# Altium footprint library Molex FFC - FPC Connectors (SMT).PcbLib: 638 footprints (part 7 of 40)
Each footprint in its own frame and in the unit in brackets; x right, y up, seen from the top. Pads: shape width x height; smd on the part's side, far side on the other; paste and mask are expansions set on the pad; w line width, h text height; cw(c..) or ccw(c..) is an arc to the next point about the centre after c.
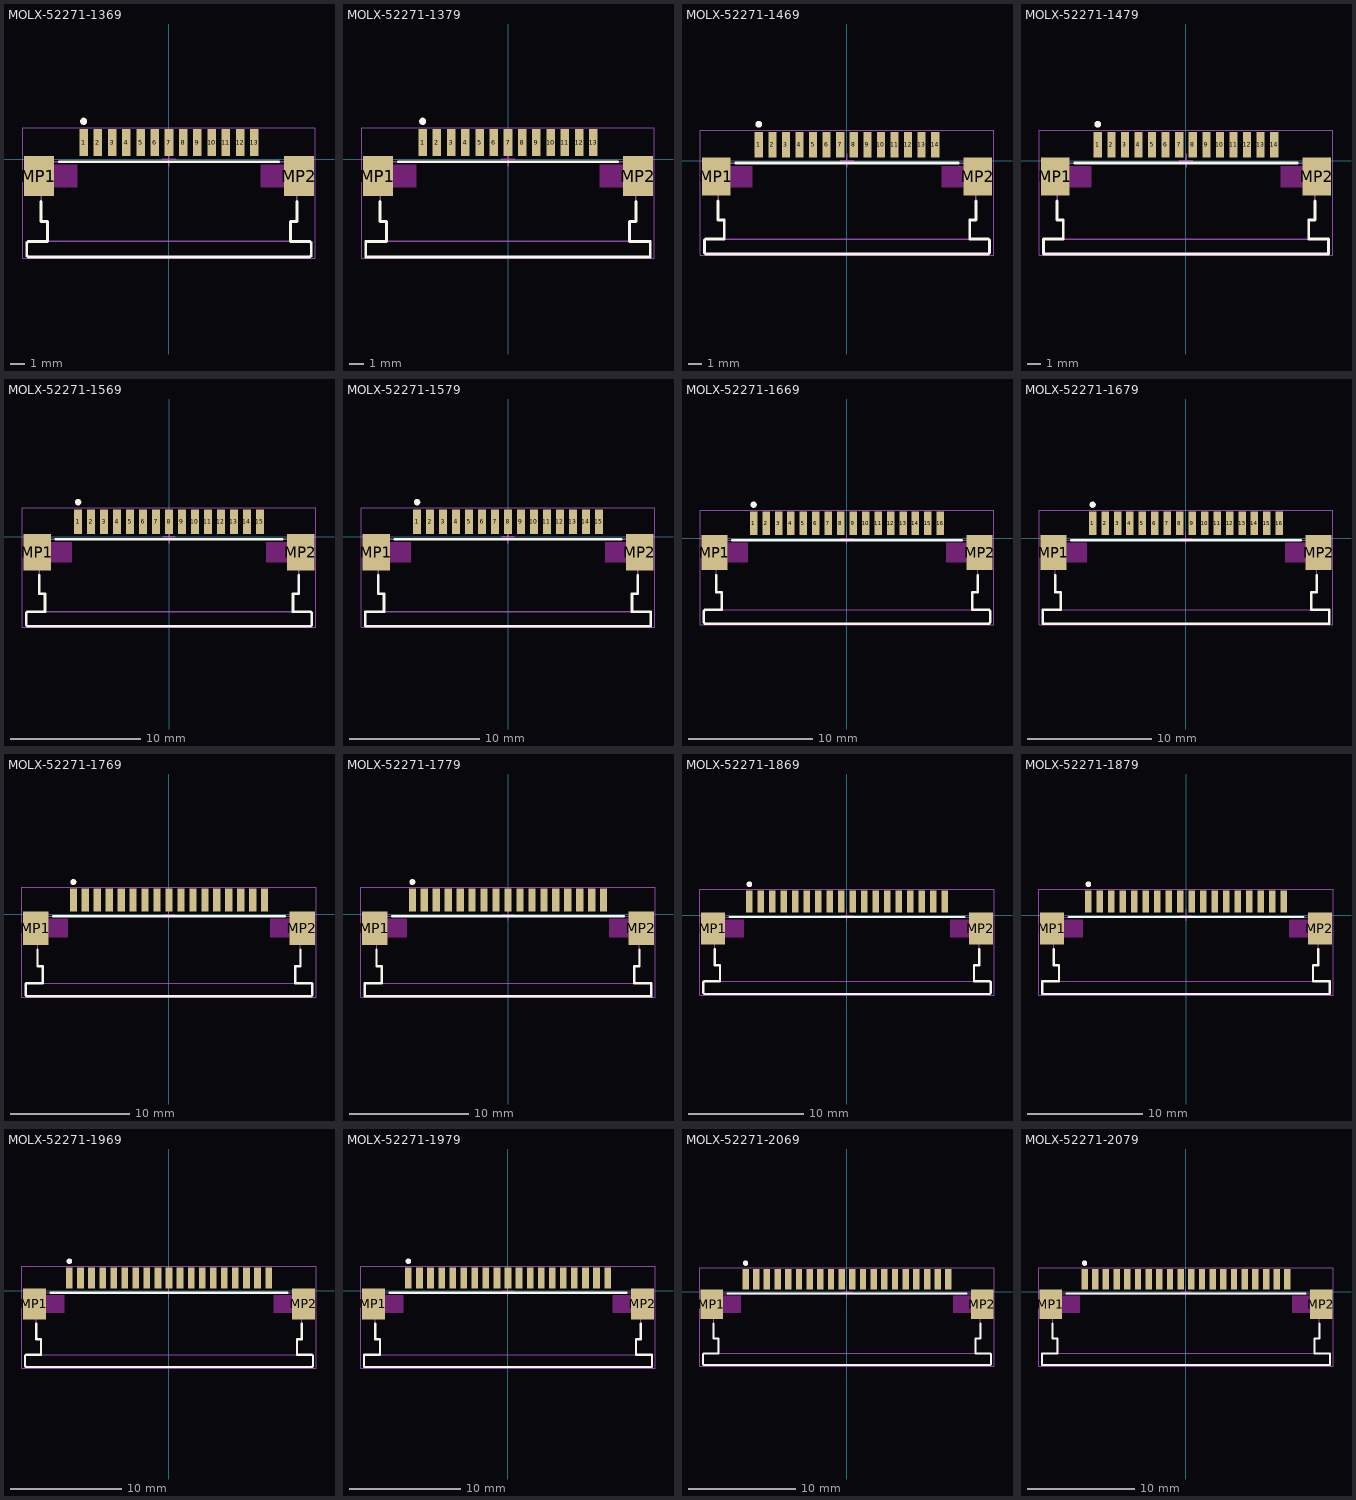
[diagram p6: the footprints below, top view; thin cyan lines are the x and y axes]

## MOLX-52271-1369 [mm] "FPC Connector, 13-Leads, Right Angle, Pitch 1.0 mm, Mated Height 3.0 mm, SMT"
height 3.012
pads (15):
  rect 0.6x1.9 smd: 1(-6,1.175) 2(-5,1.175) 3(-4,1.175) 4(-3,1.175) 5(-2,1.175) 6(-1,1.175) 7(0,1.175) 8(1,1.175) 9(2,1.175) 10(3,1.175) 11(4,1.175) 12(5,1.175) 13(6,1.175)
  rect 2.1x2.8 smd: MP1(-9.15,-1.175) MP2(9.15,-1.175)
Top Overlay:
  circle w0.25: c-6,2.675 r0.125
  lines w0.2: -9,-2.975 -9,-4.375 -8.55,-4.375 -8.55,-5.775 -9.912,-5.775 -10,-5.863 -10,-6.787 -9.912,-6.875 9.912,-6.875 10,-6.787 10,-5.863 9.912,-5.775 8.55,-5.775 8.55,-4.375 9,-4.375 9,-2.975 ; -7.7,-0.175 7.7,-0.175
Keep-Out Layer:
  rectangle: -8.1,-1.975 -6.45,-0.375
  rectangle: 6.45,-1.975 8.1,-0.375
Mechanical 13:
  lines w0.1: -8.55,-5.775 -8.55,-4.375 -9,-4.375 -9,-0.175 9,-0.175 9,-4.375 8.55,-4.375 8.55,-5.775 ; -10,-6.787 -10,-5.863 -9.912,-5.775 9.912,-5.775 10,-5.863 10,-6.787 9.912,-6.875 -9.912,-6.875 -10,-6.787
Mechanical 15:
  lines w0.05: -10.3,-6.975 10.3,-6.975 10.3,2.225 -10.3,2.225 -10.3,-6.975
  lines w0.1: -0.5,0 0.5,0 ; 0,-0.5 0,0.5
3D body: height 0.25, standoff 0, extent -10,-6.875 10,1.825

## MOLX-52271-1379 [mm] "FPC Connector, 13-Leads, Right Angle, Pitch 1.0 mm, Mated Height 3.0 mm, SMT"
height 3.012
pads (15):
  rect 0.6x1.9 smd: 1(-6,1.175) 2(-5,1.175) 3(-4,1.175) 4(-3,1.175) 5(-2,1.175) 6(-1,1.175) 7(0,1.175) 8(1,1.175) 9(2,1.175) 10(3,1.175) 11(4,1.175) 12(5,1.175) 13(6,1.175)
  rect 2.1x2.8 smd: MP1(-9.15,-1.175) MP2(9.15,-1.175)
Top Overlay:
  circle w0.25: c-6,2.675 r0.125
  lines w0.2: -9,-2.975 -9,-4.375 -8.55,-4.375 -8.55,-5.775 -10,-5.775 -10,-6.875 10,-6.875 10,-5.775 8.55,-5.775 8.55,-4.375 9,-4.375 9,-2.975 ; -7.7,-0.175 7.7,-0.175
Keep-Out Layer:
  rectangle: 6.45,-1.975 8.1,-0.375
  region: -6.45,-0.375 -8.1,-0.375 -8.1,-1.975 -6.45,-1.975
Mechanical 13:
  lines w0.1: -8.55,-5.775 -8.55,-4.375 -9,-4.375 -9,-0.175 9,-0.175 9,-4.375 8.55,-4.375 8.55,-5.775 ; -10,-6.875 -10,-5.775 10,-5.775 10,-6.875 -10,-6.875
Mechanical 15:
  lines w0.05: -10.3,-6.975 10.3,-6.975 10.3,2.225 -10.3,2.225 -10.3,-6.975
  lines w0.1: -0.5,0 0.5,0 ; 0,-0.5 0,0.5
3D body: height 0.25, standoff 0, extent -10,-6.875 10,1.825

## MOLX-52271-1469 [mm] "FPC Connector, 14-Leads, Right Angle, Pitch 1.0 mm, Mated Height 3.0 mm, SMT"
height 3.012
pads (16):
  rect 0.6x1.9 smd: 1(-6.5,1.175) 2(-5.5,1.175) 3(-4.5,1.175) 4(-3.5,1.175) 5(-2.5,1.175) 6(-1.5,1.175) 7(-0.5,1.175) 8(0.5,1.175) 9(1.5,1.175) 10(2.5,1.175) 11(3.5,1.175) 12(4.5,1.175) 13(5.5,1.175) 14(6.5,1.175)
  rect 2.1x2.8 smd: MP1(-9.65,-1.175) MP2(9.65,-1.175)
Top Overlay:
  circle w0.25: c-6.5,2.675 r0.125
  lines w0.2: -9.5,-2.975 -9.5,-4.375 -9.05,-4.375 -9.05,-5.775 -10.412,-5.775 -10.5,-5.863 -10.5,-6.787 -10.412,-6.875 10.412,-6.875 10.5,-6.787 10.5,-5.863 10.412,-5.775 9.05,-5.775 9.05,-4.375 9.5,-4.375 9.5,-2.975 ; -8.2,-0.175 8.2,-0.175
Keep-Out Layer:
  rectangle: -8.6,-1.975 -6.95,-0.375
  rectangle: 6.95,-1.975 8.6,-0.375
Mechanical 13:
  lines w0.1: -9.05,-5.775 -9.05,-4.375 -9.5,-4.375 -9.5,-0.175 9.5,-0.175 9.5,-4.375 9.05,-4.375 9.05,-5.775 ; -10.5,-6.787 -10.5,-5.863 -10.412,-5.775 10.412,-5.775 10.5,-5.863 10.5,-6.787 10.412,-6.875 -10.412,-6.875 -10.5,-6.787
Mechanical 15:
  lines w0.05: -10.8,-6.975 10.8,-6.975 10.8,2.225 -10.8,2.225 -10.8,-6.975
  lines w0.1: -0.5,0 0.5,0 ; 0,-0.5 0,0.5
3D body: height 0.25, standoff 0, extent -10.5,-6.875 10.5,1.825

## MOLX-52271-1479 [mm] "FPC Connector, 14-Leads, Right Angle, Pitch 1.0 mm, Mated Height 3.0 mm, SMT"
height 3.012
pads (16):
  rect 0.6x1.9 smd: 1(-6.5,1.175) 2(-5.5,1.175) 3(-4.5,1.175) 4(-3.5,1.175) 5(-2.5,1.175) 6(-1.5,1.175) 7(-0.5,1.175) 8(0.5,1.175) 9(1.5,1.175) 10(2.5,1.175) 11(3.5,1.175) 12(4.5,1.175) 13(5.5,1.175) 14(6.5,1.175)
  rect 2.1x2.8 smd: MP1(-9.65,-1.175) MP2(9.65,-1.175)
Top Overlay:
  circle w0.25: c-6.5,2.675 r0.125
  lines w0.2: -9.5,-2.975 -9.5,-4.375 -9.05,-4.375 -9.05,-5.775 -10.5,-5.775 -10.5,-6.875 10.5,-6.875 10.5,-5.775 9.05,-5.775 9.05,-4.375 9.5,-4.375 9.5,-2.975 ; -8.2,-0.175 8.2,-0.175
Keep-Out Layer:
  region: -6.95,-0.375 -8.6,-0.375 -8.6,-1.975 -6.95,-1.975
  rectangle: 6.95,-1.975 8.6,-0.375
Mechanical 13:
  lines w0.1: -9.05,-5.775 -9.05,-4.375 -9.5,-4.375 -9.5,-0.175 9.5,-0.175 9.5,-4.375 9.05,-4.375 9.05,-5.775 ; -10.5,-6.875 10.5,-6.875 10.5,-5.775 -10.5,-5.775 -10.5,-6.875
Mechanical 15:
  lines w0.05: -10.8,-6.975 -10.8,2.225 10.8,2.225 10.8,-6.975 -10.8,-6.975
  lines w0.1: -0.5,0 0.5,0 ; 0,-0.5 0,0.5
3D body: height 0.25, standoff 0, extent -10.5,-6.875 10.5,1.825

## MOLX-52271-1569 [mm] "FPC Connector, 15-Leads, Right Angle, Pitch 1.0 mm, Mated Height 3.0 mm, SMT"
height 3.012
pads (17):
  rect 0.6x1.9 smd: 1(-7,1.175) 2(-6,1.175) 3(-5,1.175) 4(-4,1.175) 5(-3,1.175) 6(-2,1.175) 7(-1,1.175) 8(0,1.175) 9(1,1.175) 10(2,1.175) 11(3,1.175) 12(4,1.175) 13(5,1.175) 14(6,1.175) 15(7,1.175)
  rect 2.1x2.8 smd: MP1(-10.15,-1.175) MP2(10.15,-1.175)
Top Overlay:
  circle w0.25: c-7,2.675 r0.125
  lines w0.2: -10,-2.975 -10,-4.375 -9.55,-4.375 -9.55,-5.775 -10.912,-5.775 -11,-5.863 -11,-6.787 -10.912,-6.875 10.912,-6.875 11,-6.787 11,-5.863 10.912,-5.775 9.55,-5.775 9.55,-4.375 10,-4.375 10,-2.975 ; -8.7,-0.175 8.7,-0.175
Keep-Out Layer:
  rectangle: -9.1,-1.975 -7.45,-0.375
  rectangle: 7.45,-1.975 9.1,-0.375
Mechanical 13:
  lines w0.1: -9.55,-5.775 -9.55,-4.375 -10,-4.375 -10,-0.175 10,-0.175 10,-4.375 9.55,-4.375 9.55,-5.775 ; -11,-6.787 -11,-5.863 -10.912,-5.775 10.912,-5.775 11,-5.863 11,-6.787 10.912,-6.875 -10.912,-6.875 -11,-6.787
Mechanical 15:
  lines w0.05: -11.3,-6.975 11.3,-6.975 11.3,2.225 -11.3,2.225 -11.3,-6.975
  lines w0.1: -0.5,0 0.5,0 ; 0,-0.5 0,0.5
3D body: height 0.25, standoff 0, extent -11,-6.875 11,1.825

## MOLX-52271-1579 [mm] "FPC Connector, 15-Leads, Right Angle, Pitch 1.0 mm, Mated Height 3.0 mm, SMT"
height 3.012
pads (17):
  rect 0.6x1.9 smd: 1(-7,1.175) 2(-6,1.175) 3(-5,1.175) 4(-4,1.175) 5(-3,1.175) 6(-2,1.175) 7(-1,1.175) 8(0,1.175) 9(1,1.175) 10(2,1.175) 11(3,1.175) 12(4,1.175) 13(5,1.175) 14(6,1.175) 15(7,1.175)
  rect 2.1x2.8 smd: MP1(-10.15,-1.175) MP2(10.15,-1.175)
Top Overlay:
  circle w0.25: c-7,2.675 r0.125
  lines w0.2: -10,-2.975 -10,-4.375 -9.55,-4.375 -9.55,-5.775 -11,-5.775 -11,-6.875 11,-6.875 11,-5.775 9.55,-5.775 9.55,-4.375 10,-4.375 10,-2.975 ; -8.7,-0.175 8.7,-0.175
Keep-Out Layer:
  rectangle: 7.45,-1.975 9.1,-0.375
  region: -7.45,-0.375 -9.1,-0.375 -9.1,-1.975 -7.45,-1.975
Mechanical 13:
  lines w0.1: -9.55,-5.775 -9.55,-4.375 -10,-4.375 -10,-0.175 10,-0.175 10,-4.375 9.55,-4.375 9.55,-5.775 ; -11,-6.875 -11,-5.775 11,-5.775 11,-6.875 -11,-6.875
Mechanical 15:
  lines w0.05: -11.3,-6.975 11.3,-6.975 11.3,2.225 -11.3,2.225 -11.3,-6.975
  lines w0.1: -0.5,0 0.5,0 ; 0,-0.5 0,0.5
3D body: height 0.25, standoff 0, extent -11,-6.875 11,1.825

## MOLX-52271-1669 [mm] "FPC Connector, 16-Leads, Right Angle, Pitch 1.0 mm, Mated Height 3.0 mm, SMT"
height 3.012
pads (18):
  rect 0.6x1.9 smd: 1(-7.5,1.175) 2(-6.5,1.175) 3(-5.5,1.175) 4(-4.5,1.175) 5(-3.5,1.175) 6(-2.5,1.175) 7(-1.5,1.175) 8(-0.5,1.175) 9(0.5,1.175) 10(1.5,1.175) 11(2.5,1.175) 12(3.5,1.175) 13(4.5,1.175) 14(5.5,1.175) 15(6.5,1.175) 16(7.5,1.175)
  rect 2.1x2.8 smd: MP1(-10.65,-1.175) MP2(10.65,-1.175)
Top Overlay:
  circle w0.25: c-7.5,2.675 r0.125
  lines w0.2: -10.5,-2.975 -10.5,-4.375 -10.05,-4.375 -10.05,-5.775 -11.412,-5.775 -11.5,-5.863 -11.5,-6.787 -11.412,-6.875 11.412,-6.875 11.5,-6.787 11.5,-5.863 11.412,-5.775 10.05,-5.775 10.05,-4.375 10.5,-4.375 10.5,-2.975 ; -9.2,-0.175 9.2,-0.175
Keep-Out Layer:
  rectangle: -9.6,-1.975 -7.95,-0.375
  rectangle: 7.95,-1.975 9.6,-0.375
Mechanical 13:
  lines w0.1: -10.05,-5.775 -10.05,-4.375 -10.5,-4.375 -10.5,-0.175 10.5,-0.175 10.5,-4.375 10.05,-4.375 10.05,-5.775 ; -11.5,-6.787 -11.5,-5.863 -11.412,-5.775 11.412,-5.775 11.5,-5.863 11.5,-6.787 11.412,-6.875 -11.412,-6.875 -11.5,-6.787
Mechanical 15:
  lines w0.05: -11.8,-6.975 11.8,-6.975 11.8,2.225 -11.8,2.225 -11.8,-6.975
  lines w0.1: -0.5,0 0.5,0 ; 0,-0.5 0,0.5
3D body: height 0.25, standoff 0, extent -11.5,-6.875 11.5,1.825

## MOLX-52271-1679 [mm] "FPC Connector, 16-Leads, Right Angle, Pitch 1.0 mm, Mated Height 3.0 mm, SMT"
height 3.012
pads (18):
  rect 0.6x1.9 smd: 1(-7.5,1.175) 2(-6.5,1.175) 3(-5.5,1.175) 4(-4.5,1.175) 5(-3.5,1.175) 6(-2.5,1.175) 7(-1.5,1.175) 8(-0.5,1.175) 9(0.5,1.175) 10(1.5,1.175) 11(2.5,1.175) 12(3.5,1.175) 13(4.5,1.175) 14(5.5,1.175) 15(6.5,1.175) 16(7.5,1.175)
  rect 2.1x2.8 smd: MP1(-10.65,-1.175) MP2(10.65,-1.175)
Top Overlay:
  circle w0.25: c-7.5,2.675 r0.125
  lines w0.2: -10.5,-2.975 -10.5,-4.375 -10.05,-4.375 -10.05,-5.775 -11.5,-5.775 -11.5,-6.875 11.5,-6.875 11.5,-5.775 10.05,-5.775 10.05,-4.375 10.5,-4.375 10.5,-2.975 ; -9.2,-0.175 9.2,-0.175
Keep-Out Layer:
  region: -7.95,-0.375 -9.6,-0.375 -9.6,-1.975 -7.95,-1.975
  rectangle: 7.95,-1.975 9.6,-0.375
Mechanical 13:
  lines w0.1: -10.05,-5.775 -10.05,-4.375 -10.5,-4.375 -10.5,-0.175 10.5,-0.175 10.5,-4.375 10.05,-4.375 10.05,-5.775 ; -11.5,-6.875 11.5,-6.875 11.5,-5.775 -11.5,-5.775 -11.5,-6.875
Mechanical 15:
  lines w0.05: -11.8,-6.975 -11.8,2.225 11.8,2.225 11.8,-6.975 -11.8,-6.975
  lines w0.1: -0.5,0 0.5,0 ; 0,-0.5 0,0.5
3D body: height 0.25, standoff 0, extent -11.5,-6.875 11.5,1.825

## MOLX-52271-1769 [mm] "FPC Connector, 17-Leads, Right Angle, Pitch 1.0 mm, Mated Height 3.0 mm, SMT"
height 3.012
pads (19):
  rect 0.6x1.9 smd: 1(-8,1.175) 2(-7,1.175) 3(-6,1.175) 4(-5,1.175) 5(-4,1.175) 6(-3,1.175) 7(-2,1.175) 8(-1,1.175) 9(0,1.175) 10(1,1.175) 11(2,1.175) 12(3,1.175) 13(4,1.175) 14(5,1.175) 15(6,1.175) 16(7,1.175) 17(8,1.175)
  rect 2.1x2.8 smd: MP1(-11.15,-1.175) MP2(11.15,-1.175)
Top Overlay:
  circle w0.25: c-8,2.675 r0.125
  lines w0.2: -11,-2.975 -11,-4.375 -10.55,-4.375 -10.55,-5.775 -11.912,-5.775 -12,-5.863 -12,-6.787 -11.912,-6.875 11.912,-6.875 12,-6.787 12,-5.863 11.912,-5.775 10.55,-5.775 10.55,-4.375 11,-4.375 11,-2.975 ; -9.7,-0.175 9.7,-0.175
Keep-Out Layer:
  rectangle: -10.1,-1.975 -8.45,-0.375
  rectangle: 8.45,-1.975 10.1,-0.375
Mechanical 13:
  lines w0.1: -10.55,-5.775 -10.55,-4.375 -11,-4.375 -11,-0.175 11,-0.175 11,-4.375 10.55,-4.375 10.55,-5.775 ; -12,-6.787 -12,-5.863 -11.912,-5.775 11.912,-5.775 12,-5.863 12,-6.787 11.912,-6.875 -11.912,-6.875 -12,-6.787
Mechanical 15:
  lines w0.05: -12.3,-6.975 12.3,-6.975 12.3,2.225 -12.3,2.225 -12.3,-6.975
  lines w0.1: -0.5,0 0.5,0 ; 0,-0.5 0,0.5
3D body: height 0.25, standoff 0, extent -12,-6.875 12,1.825

## MOLX-52271-1779 [mm] "FPC Connector, 17-Leads, Right Angle, Pitch 1.0 mm, Mated Height 3.0 mm, SMT"
height 3.012
pads (19):
  rect 0.6x1.9 smd: 1(-8,1.175) 2(-7,1.175) 3(-6,1.175) 4(-5,1.175) 5(-4,1.175) 6(-3,1.175) 7(-2,1.175) 8(-1,1.175) 9(0,1.175) 10(1,1.175) 11(2,1.175) 12(3,1.175) 13(4,1.175) 14(5,1.175) 15(6,1.175) 16(7,1.175) 17(8,1.175)
  rect 2.1x2.8 smd: MP1(-11.15,-1.175) MP2(11.15,-1.175)
Top Overlay:
  circle w0.25: c-8,2.675 r0.125
  lines w0.2: -11,-2.975 -11,-4.375 -10.55,-4.375 -10.55,-5.775 -12,-5.775 -12,-6.875 12,-6.875 12,-5.775 10.55,-5.775 10.55,-4.375 11,-4.375 11.001,-2.975 ; -9.7,-0.175 9.7,-0.175
Keep-Out Layer:
  rectangle: 8.45,-1.975 10.1,-0.375
  region: -8.45,-0.375 -10.1,-0.375 -10.1,-1.975 -8.45,-1.975
Mechanical 13:
  lines w0.1: -10.55,-5.775 -10.55,-4.375 -11,-4.375 -11,-0.175 11,-0.175 11,-4.375 10.55,-4.375 10.55,-5.775 ; -12,-6.875 -12,-5.775 12,-5.775 12,-6.875 -12,-6.875
Mechanical 15:
  lines w0.05: -12.3,-6.975 -12.3,2.225 12.3,2.225 12.3,-6.975 -12.3,-6.975
  lines w0.1: -0.5,0 0.5,0 ; 0,-0.5 0,0.5
3D body: height 0.25, standoff 0, extent -12,-6.875 12,1.825

## MOLX-52271-1869 [mm] "FPC Connector, 18-Leads, Right Angle, Pitch 1.0 mm, Mated Height 3.0 mm, SMT"
height 3.012
pads (20):
  rect 0.6x1.9 smd: 1(-8.5,1.175) 2(-7.5,1.175) 3(-6.5,1.175) 4(-5.5,1.175) 5(-4.5,1.175) 6(-3.5,1.175) 7(-2.5,1.175) 8(-1.5,1.175) 9(-0.5,1.175) 10(0.5,1.175) 11(1.5,1.175) 12(2.5,1.175) 13(3.5,1.175) 14(4.5,1.175) 15(5.5,1.175) 16(6.5,1.175) 17(7.5,1.175) 18(8.5,1.175)
  rect 2.1x2.8 smd: MP1(-11.65,-1.175) MP2(11.65,-1.175)
Top Overlay:
  circle w0.25: c-8.5,2.675 r0.125
  lines w0.2: -11.5,-2.975 -11.5,-4.375 -11.05,-4.375 -11.05,-5.775 -12.412,-5.775 -12.5,-5.863 -12.5,-6.787 -12.412,-6.875 12.412,-6.875 12.5,-6.787 12.5,-5.863 12.412,-5.775 11.05,-5.775 11.05,-4.375 11.5,-4.375 11.5,-2.975 ; -10.2,-0.175 10.2,-0.175
Keep-Out Layer:
  rectangle: -10.6,-1.975 -8.95,-0.375
  rectangle: 8.95,-1.975 10.6,-0.375
Mechanical 13:
  lines w0.1: -11.05,-5.775 -11.05,-4.375 -11.5,-4.375 -11.5,-0.175 11.5,-0.175 11.5,-4.375 11.05,-4.375 11.05,-5.775 ; -12.5,-6.787 -12.5,-5.863 -12.412,-5.775 12.412,-5.775 12.5,-5.863 12.5,-6.787 12.412,-6.875 -12.412,-6.875 -12.5,-6.787
Mechanical 15:
  lines w0.05: -12.8,-6.975 12.8,-6.975 12.8,2.225 -12.8,2.225 -12.8,-6.975
  lines w0.1: -0.5,0 0.5,0 ; 0,-0.5 0,0.5
3D body: height 0.25, standoff 0, extent -12.5,-6.875 12.5,1.825

## MOLX-52271-1879 [mm] "FPC Connector, 18-Leads, Right Angle, Pitch 1.0 mm, Mated Height 3.0 mm, SMT"
height 3.012
pads (20):
  rect 0.6x1.9 smd: 1(-8.5,1.175) 2(-7.5,1.175) 3(-6.5,1.175) 4(-5.5,1.175) 5(-4.5,1.175) 6(-3.5,1.175) 7(-2.5,1.175) 8(-1.5,1.175) 9(-0.5,1.175) 10(0.5,1.175) 11(1.5,1.175) 12(2.5,1.175) 13(3.5,1.175) 14(4.5,1.175) 15(5.5,1.175) 16(6.5,1.175) 17(7.5,1.175) 18(8.5,1.175)
  rect 2.1x2.8 smd: MP1(-11.65,-1.175) MP2(11.65,-1.175)
Top Overlay:
  circle w0.25: c-8.5,2.675 r0.125
  lines w0.2: -11.5,-2.975 -11.5,-4.375 -11.05,-4.375 -11.05,-5.775 -12.5,-5.775 -12.5,-6.875 12.5,-6.875 12.5,-5.775 11.05,-5.775 11.05,-4.375 11.5,-4.375 11.5,-2.975 ; -10.2,-0.175 10.2,-0.175
Keep-Out Layer:
  region: -8.95,-0.375 -10.6,-0.375 -10.6,-1.975 -8.95,-1.975
  rectangle: 8.95,-1.975 10.6,-0.375
Mechanical 13:
  lines w0.1: -11.05,-5.775 -11.05,-4.375 -11.5,-4.375 -11.5,-0.175 11.5,-0.175 11.5,-4.375 11.05,-4.375 11.05,-5.775 ; 12.5,-5.775 12.5,-6.875 -12.5,-6.875 -12.5,-5.775 12.5,-5.775
Mechanical 15:
  lines w0.05: -12.8,-6.975 -12.8,2.225 12.8,2.225 12.8,-6.975 -12.8,-6.975
  lines w0.1: -0.5,0 0.5,0 ; 0,-0.5 0,0.5
3D body: height 0.25, standoff 0, extent -12.5,-6.875 12.5,1.825

## MOLX-52271-1969 [mm] "FPC Connector, 19-Leads, Right Angle, Pitch 1.0 mm, Mated Height 3.0 mm, SMT"
height 3.012
pads (21):
  rect 0.6x1.9 smd: 1(-9,1.175) 2(-8,1.175) 3(-7,1.175) 4(-6,1.175) 5(-5,1.175) 6(-4,1.175) 7(-3,1.175) 8(-2,1.175) 9(-1,1.175) 10(0,1.175) 11(1,1.175) 12(2,1.175) 13(3,1.175) 14(4,1.175) 15(5,1.175) 16(6,1.175) 17(7,1.175) 18(8,1.175) 19(9,1.175)
  rect 2.1x2.8 smd: MP1(-12.15,-1.175) MP2(12.15,-1.175)
Top Overlay:
  circle w0.25: c-9,2.675 r0.125
  lines w0.2: -12,-2.975 -12,-4.375 -11.55,-4.375 -11.55,-5.775 -12.912,-5.775 -13,-5.863 -13,-6.787 -12.912,-6.875 12.912,-6.875 13,-6.787 13,-5.863 12.912,-5.775 11.55,-5.775 11.55,-4.375 12,-4.375 12,-2.975 ; -10.7,-0.175 10.7,-0.175
Keep-Out Layer:
  rectangle: -11.1,-1.975 -9.45,-0.375
  rectangle: 9.45,-1.975 11.1,-0.375
Mechanical 13:
  lines w0.1: -11.55,-5.775 -11.55,-4.375 -12,-4.375 -12,-0.175 12,-0.175 12,-4.375 11.55,-4.375 11.55,-5.775 ; -13,-6.787 -13,-5.863 -12.912,-5.775 12.912,-5.775 13,-5.863 13,-6.787 12.912,-6.875 -12.912,-6.875 -13,-6.787
Mechanical 15:
  lines w0.05: -13.3,-6.975 13.3,-6.975 13.3,2.225 -13.3,2.225 -13.3,-6.975
  lines w0.1: -0.5,-0.127 0.5,-0.127 ; 0,-0.627 0,0.373
3D body: height 0.25, standoff 0, extent -13,-6.875 13,1.825

## MOLX-52271-1979 [mm] "FPC Connector, 19-Leads, Right Angle, Pitch 1.0 mm, Mated Height 3.0 mm, SMT"
height 3.012
pads (21):
  rect 0.6x1.9 smd: 1(-9,1.175) 2(-8,1.175) 3(-7,1.175) 4(-6,1.175) 5(-5,1.175) 6(-4,1.175) 7(-3,1.175) 8(-2,1.175) 9(-1,1.175) 10(0,1.175) 11(1,1.175) 12(2,1.175) 13(3,1.175) 14(4,1.175) 15(5,1.175) 16(6,1.175) 17(7,1.175) 18(8,1.175) 19(9,1.175)
  rect 2.1x2.8 smd: MP1(-12.15,-1.175) MP2(12.15,-1.175)
Top Overlay:
  circle w0.25: c-9,2.675 r0.125
  lines w0.2: -12,-2.975 -12,-4.375 -11.55,-4.375 -11.55,-5.775 -13,-5.775 -13,-6.875 13,-6.875 13,-5.775 11.55,-5.775 11.55,-4.375 12,-4.375 12,-2.975 ; -10.7,-0.175 10.7,-0.175
Keep-Out Layer:
  rectangle: 9.45,-1.975 11.1,-0.375
  region: -9.45,-0.375 -11.1,-0.375 -11.1,-1.975 -9.45,-1.975
Mechanical 13:
  lines w0.1: -11.55,-5.775 -11.55,-4.375 -12,-4.375 -12,-0.175 12,-0.175 12,-4.375 11.55,-4.375 11.55,-5.775 ; -13,-6.875 -13,-5.775 13,-5.775 13,-6.875 -13,-6.875
Mechanical 15:
  lines w0.05: -13.3,-6.975 13.3,-6.975 13.3,2.225 -13.3,2.225 -13.3,-6.975
  lines w0.1: -0.5,0 0.5,0 ; 0,-0.5 0,0.5
3D body: height 0.25, standoff 0, extent -13,-6.875 13,1.825

## MOLX-52271-2069 [mm] "FPC Connector, 20-Leads, Right Angle, Pitch 1.0 mm, Mated Height 3.0 mm, SMT"
height 3.012
pads (22):
  rect 0.6x1.9 smd: 1(-9.5,1.175) 2(-8.5,1.175) 3(-7.5,1.175) 4(-6.5,1.175) 5(-5.5,1.175) 6(-4.5,1.175) 7(-3.5,1.175) 8(-2.5,1.175) 9(-1.5,1.175) 10(-0.5,1.175) 11(0.5,1.175) 12(1.5,1.175) 13(2.5,1.175) 14(3.5,1.175) 15(4.5,1.175) 16(5.5,1.175) 17(6.5,1.175) 18(7.5,1.175) 19(8.5,1.175) 20(9.5,1.175)
  rect 2.1x2.8 smd: MP1(-12.65,-1.175) MP2(12.65,-1.175)
Top Overlay:
  circle w0.25: c-9.5,2.675 r0.125
  lines w0.2: -12.5,-2.975 -12.5,-4.375 -12.05,-4.375 -12.05,-5.775 -13.412,-5.775 -13.5,-5.863 -13.5,-6.787 -13.412,-6.875 13.412,-6.875 13.5,-6.787 13.5,-5.863 13.412,-5.775 12.05,-5.775 12.05,-4.375 12.5,-4.375 12.5,-2.975 ; -11.2,-0.175 11.2,-0.175
Keep-Out Layer:
  rectangle: -11.6,-1.975 -9.95,-0.375
  rectangle: 9.95,-1.975 11.6,-0.375
Mechanical 13:
  lines w0.1: -12.05,-5.775 -12.05,-4.375 -12.5,-4.375 -12.5,-0.175 12.5,-0.175 12.5,-4.375 12.05,-4.375 12.05,-5.775 ; -13.5,-6.787 -13.5,-5.863 -13.412,-5.775 13.412,-5.775 13.5,-5.863 13.5,-6.787 13.412,-6.875 -13.412,-6.875 -13.5,-6.787
Mechanical 15:
  lines w0.05: -13.8,-6.975 13.8,-6.975 13.8,2.225 -13.8,2.225 -13.8,-6.975
  lines w0.1: -0.5,0 0.5,0 ; 0,-0.5 0,0.5
3D body: height 0.25, standoff 0, extent -13.5,-6.875 13.5,1.825

## MOLX-52271-2079 [mm] "FPC Connector, 20-Leads, Right Angle, Pitch 1.0 mm, Mated Height 3.0 mm, SMT"
height 3.012
pads (22):
  rect 0.6x1.9 smd: 1(-9.5,1.175) 2(-8.5,1.175) 3(-7.5,1.175) 4(-6.5,1.175) 5(-5.5,1.175) 6(-4.5,1.175) 7(-3.5,1.175) 8(-2.5,1.175) 9(-1.5,1.175) 10(-0.5,1.175) 11(0.5,1.175) 12(1.5,1.175) 13(2.5,1.175) 14(3.5,1.175) 15(4.5,1.175) 16(5.5,1.175) 17(6.5,1.175) 18(7.5,1.175) 19(8.5,1.175) 20(9.5,1.175)
  rect 2.1x2.8 smd: MP1(-12.65,-1.175) MP2(12.65,-1.175)
Top Overlay:
  circle w0.25: c-9.5,2.675 r0.125
  lines w0.2: -12.5,-2.975 -12.5,-4.375 -12.05,-4.375 -12.05,-5.775 -13.5,-5.775 -13.5,-6.875 13.5,-6.875 13.5,-5.775 12.05,-5.775 12.05,-4.375 12.5,-4.375 12.5,-2.975 ; -11.2,-0.175 11.2,-0.175
Keep-Out Layer:
  rectangle: 9.95,-1.975 11.6,-0.375
  region: -9.95,-0.375 -11.6,-0.375 -11.6,-1.975 -9.95,-1.975
Mechanical 13:
  lines w0.1: -12.05,-5.775 -12.05,-4.375 -12.5,-4.375 -12.5,-0.175 12.5,-0.175 12.5,-4.375 12.05,-4.375 12.05,-5.775 ; -13.5,-6.875 13.5,-6.875 13.5,-5.775 -13.5,-5.775 -13.5,-6.875
Mechanical 15:
  lines w0.05: -13.8,-6.975 13.8,-6.975 13.8,2.225 -13.8,2.225 -13.8,-6.975
  lines w0.1: -0.5,0 0.5,0 ; 0,-0.5 0,0.5
3D body: height 0.25, standoff 0, extent -13.5,-6.875 13.5,1.825